# Altium footprint library sun_library.PcbLib: 412 footprints (part 26 of 26)
Each footprint in its own frame and in the unit in brackets; x right, y up, seen from the top. Pads: shape width x height; smd on the part's side, far side on the other; paste and mask are expansions set on the pad; w line width, h text height; cw(c..) or ccw(c..) is an arc to the next point about the centre after c.
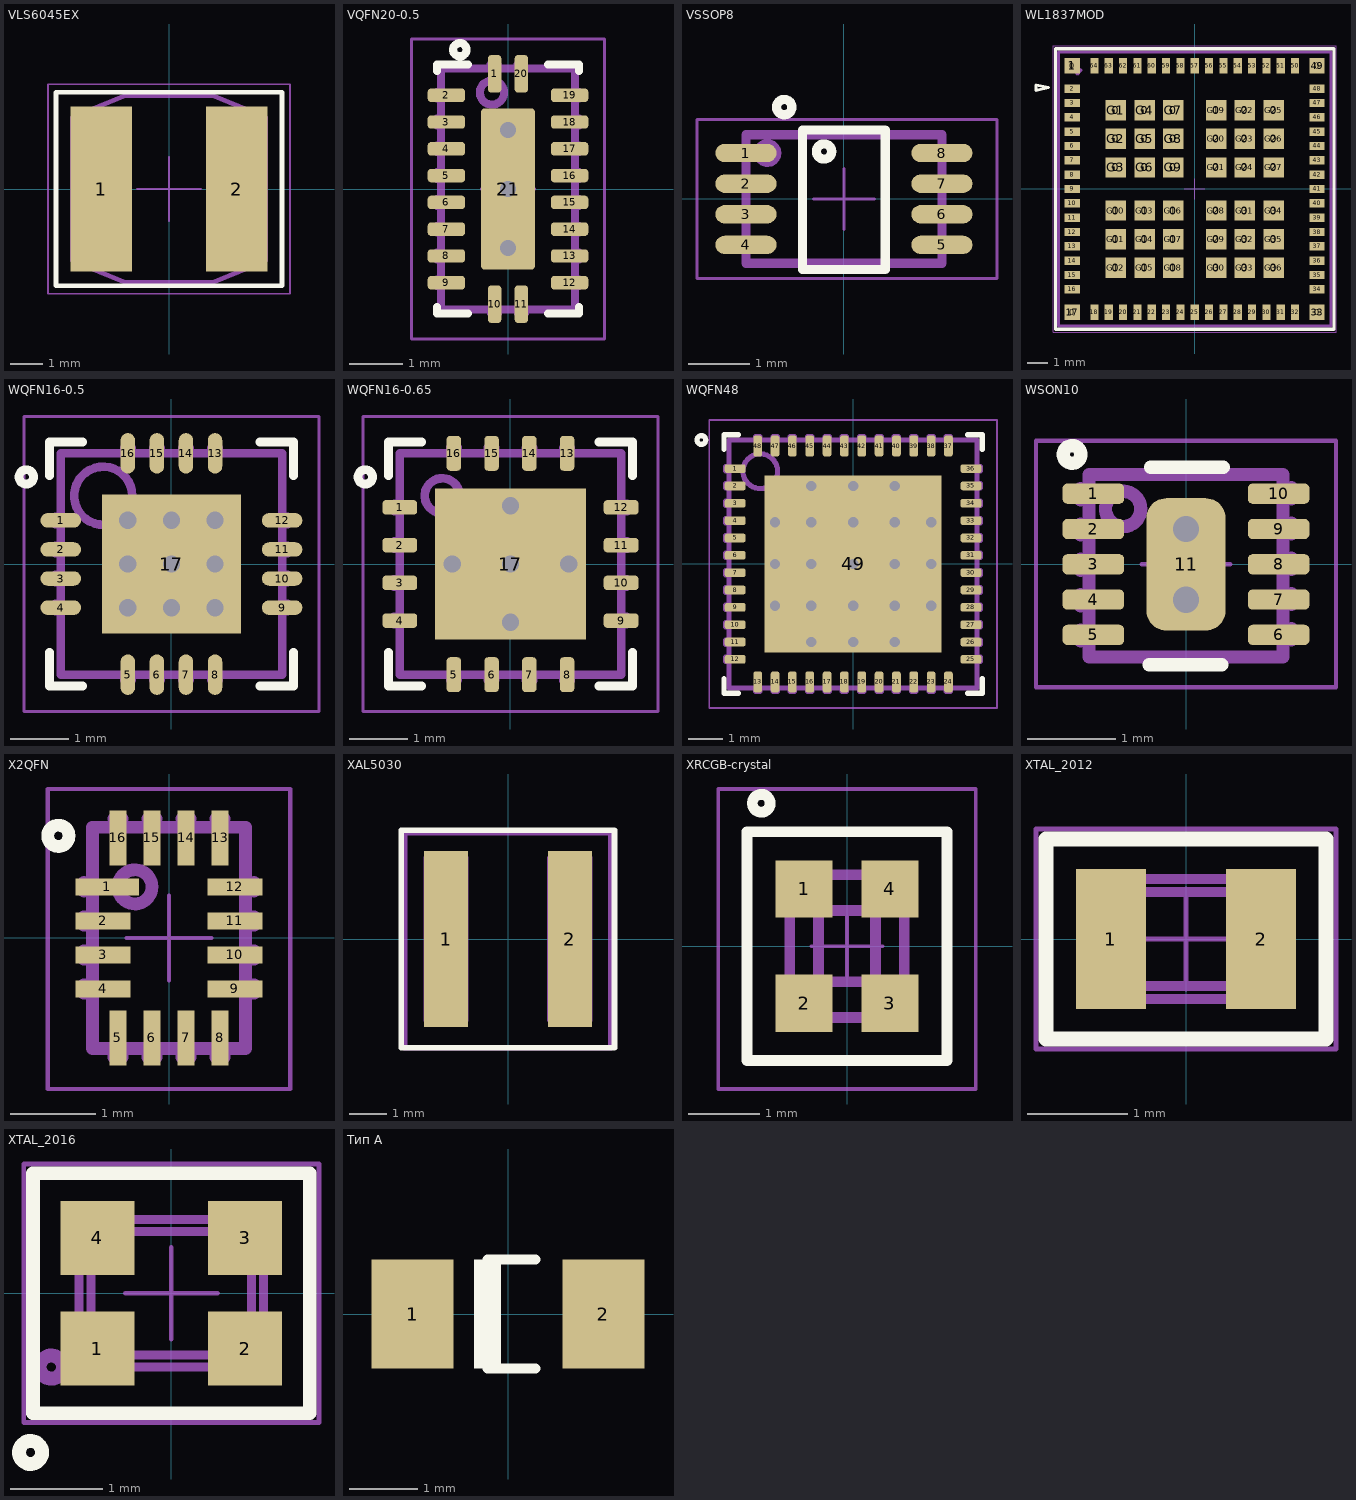
[diagram p25: the footprints below, top view; thin cyan lines are the x and y axes]

## VLS6045EX [mm] "SMT power inductors, VLS6045EX series"
height 3
pads (2):
  rect 1.9x5.1 smd: 1(-2.1,0) 2(2.1,0)
Top Overlay:
  lines w0.15: -3.5,-3 -3.5,3 3.5,3 3.5,-3 -3.5,-3
TopAssy 13:
  circle w0.15: c-1.9,0 r0.4
  lines w0.15: -3,-2.218 -3,2.218 -1.333,2.9 1.333,2.9 3,2.218 3,-2.218 1.333,-2.9 -1.333,-2.9 -3,-2.218
CourtTop 15:
  lines w0.05: -1,0 1,0 ; 0,-1 0,1 ; -3.75,-3.25 3.75,-3.25 3.75,3.25 -3.75,3.25 -3.75,-3.25
3D body "vls6045ex.step": height 4.54, standoff 0.04, extent -2.95,-3 3.05,3

## VQFN20-0.5 [mm] "20-Pin Plastic Quad Flat No-Lead 0.5 mm Pitch, IPC Low Density"
height 1
pads (21):
  rrect50% 0.25x0.7 smd mask+0.075: 1(-0.25,2.15) 10(-0.25,-2.15) 11(0.25,-2.15) 20(0.25,2.15)
  rrect50% 0.7x0.25 smd mask+0.075: 2(-1.15,1.75) 3(-1.15,1.25) 4(-1.15,0.75) 5(-1.15,0.25) 6(-1.15,-0.25) 7(-1.15,-0.75) 8(-1.15,-1.25) 9(-1.15,-1.75) 12(1.15,-1.75) 13(1.15,-1.25) 14(1.15,-0.75) 15(1.15,-0.25) 16(1.15,0.25) 17(1.15,0.75) 18(1.15,1.25) 19(1.15,1.75)
  rrect10% 1x3 smd paste-2 mask+0.075: 21(0,0)
via 0,0 diameter 0.6 hole 0.3
via 0,1.1 diameter 0.6 hole 0.3
via 0,-1.1 diameter 0.6 hole 0.3
Top Overlay:
  circle w0.15: c-0.9,2.6 r0.125
  lines w0.15: -1.325,-2.2 -1.325,-2.325 -0.75,-2.325 ; -1.325,2.2 -1.325,2.325 -0.75,2.325 ; 0.75,-2.325 1.325,-2.325 1.325,-2.2 ; 0.75,2.325 1.325,2.325 1.325,2.2
Top Paste:
  region: 0.4,-0.2 -0.4,-0.2 -0.4,-1.4 0.4,-1.4
  rectangle: -0.4,0.2 0.4,1.4
Bottom Solder:
  rectangle: -0.6,-1.6 0.6,1.6
TopAssy 13:
  circle w0.15: c-0.3,1.8 r0.225
  lines w0.15: -1.325,-1.813 -1.325,-1.688 ; -1.325,-1.313 -1.325,-1.188 ; -1.325,-0.813 -1.325,-0.688 ; -1.325,-0.313 -1.325,-0.188 ; -1.325,0.187 -1.325,0.312 ; -1.325,0.687 -1.325,0.812 ; -1.325,1.187 -1.325,1.312 ; -1.325,1.687 -1.325,1.812 ; -0.325,2.325 -0.2,2.325 ; -0.313,-2.325 -0.188,-2.325 ; 0.175,2.325 0.3,2.325 ; 0.187,-2.325 0.312,-2.325 ; 1.325,-1.812 1.325,-1.687 ; 1.325,-1.312 1.325,-1.187 ; 1.325,-0.812 1.325,-0.687 ; 1.325,-0.312 1.325,-0.187 ; 1.325,0.188 1.325,0.313 ; 1.325,0.688 1.325,0.813 ; 1.325,1.188 1.325,1.313 ; 1.325,1.688 1.325,1.813 ; -1.25,-2.25 1.25,-2.25 1.25,2.25 -1.25,2.25 -1.25,-2.25
CourtTop 15:
  lines w0.05: -0.5,0 0.5,0 ; 0,-0.5 0,-0.25 0,0.25 0,0.5 ; -1.8,-2.8 1.8,-2.8 1.8,2.8 -1.8,2.8 -1.8,-2.8
3D body: height 1.01, standoff 1, extent -0.524,1.576 -0.076,2.024
3D body "User Library-DHVQFN20.STEP": height 1, standoff 0, extent -1.26,-2.26 1.26,2.26

## VSSOP8 [mm] "VSSOP, 8-Leads, Body 2x2.3mm, Pitch 0.5mm, IPC Medium Density"
height 1.2
pads (8):
  oval 1x0.3 smd mask+0.075: 1(-1.6,0.75) 2(-1.6,0.25) 3(-1.6,-0.25) 4(-1.6,-0.75) 5(1.6,-0.75) 6(1.6,-0.25) 7(1.6,0.25) 8(1.6,0.75)
Top Overlay:
  circle w0.15: c-0.325,0.775 r0.125
  circle w0.15: c-0.975,1.5 r0.125
  lines w0.15: -0.675,-1.15 -0.675,1.125 0.675,1.125 0.675,-1.15 -0.675,-1.15
TopAssy 13:
  circle w0.15: c-1.25,0.75 r0.152
  lines w0.15: -1.6,-1.05 -1.6,1.05 1.6,1.05 1.6,-1.05 -1.6,-1.05
CourtTop 15:
  lines w0.05: -0.5,0 0.5,0 ; 0,-0.5 0,0.5 ; -2.4,-1.3 -2.4,1.3 2.5,1.3 2.5,-1.3 -2.4,-1.3
3D body "VSSOP8.step": height 0.9, standoff 0, extent -1.6,-1.05 1.6,1.05

## WL1837MOD [mm] "WL18x7MOD WiLink™ 8 Dual-Band Industrial Module"
pads (200):
  oval 0.75x0.33 on Top Paste: 0(-5.975,4.2) 0(-5.975,-4.9) 0(-5.975,-4.2) 0(-5.975,-3.5) 0(-5.975,-2.8) 0(-5.975,-2.1) 0(-5.975,-1.4) 0(-5.975,-0.7) 0(-5.975,0) 0(-5.975,0.7) 0(-5.975,1.4) 0(-5.975,2.1) 0(-5.975,2.8) 0(-5.975,3.5) 0(-5.975,4.9) 0(5.975,-4.9) 0(5.975,-2.8) 0(5.975,-1.4) 0(5.975,-0.7) 0(5.975,0) 0(5.975,0.7) 0(5.975,2.1) 0(5.975,2.8) 0(5.975,4.2) 0(5.975,4.9) 0(5.975,-4.2) 0(5.975,-3.5) 0(5.975,-2.1) 0(5.975,1.4) 0(5.975,3.5)
  rect 0.525x0.525 on Top Paste: 0(-5.975,6.025) 0(-5.975,-6.025) 0(5.975,-6.025) 0(5.975,6.025)
  oval 0.33x0.75 on Top Paste: 0(-4.9,-6.025) 0(-4.9,6.025) 0(-4.2,-6.025) 0(-4.2,6.025) 0(-3.5,-6.025) 0(-3.5,6.025) 0(-2.8,-6.025) 0(-2.8,6.025) 0(-2.1,-6.025) 0(-2.1,6.025) 0(-1.4,-6.025) 0(-1.4,6.025) 0(-0.7,-6.025) 0(-0.7,6.025) 0(0,-6.025) 0(0,6.025) 0(0.7,-6.025) 0(0.7,6.025) 0(1.4,-6.025) 0(1.4,6.025) 0(2.1,-6.025) 0(2.1,6.025) 0(2.8,6.025) 0(2.8,-6.025) 0(3.5,-6.025) 0(3.5,6.025) 0(4.2,-6.025) 0(4.2,6.025) 0(4.9,-6.025) 0(4.9,6.025)
  rect 0.7x0.7 on Top Paste: 0(-3.85,-3.85) 0(-3.85,-2.45) 0(-3.85,-1.05) 0(-3.85,1.05) 0(-3.85,2.45) 0(-3.85,3.85) 0(-2.45,-3.85) 0(-2.45,-2.45) 0(-2.45,-1.05) 0(-2.45,1.05) 0(-2.45,2.45) 0(-2.45,3.85) 0(-1.05,-3.85) 0(-1.05,-2.45) 0(-1.05,-1.05) 0(-1.05,1.05) 0(-1.05,2.45) 0(-1.05,3.85) 0(1.05,-3.85) 0(1.05,-2.45) 0(1.05,-1.05) 0(1.05,1.05) 0(1.05,2.45) 0(1.05,3.85) 0(2.45,-3.85) 0(2.45,-2.45) 0(2.45,-1.05) 0(2.45,1.05) 0(2.45,2.45) 0(2.45,3.85) 0(3.85,-3.85) 0(3.85,-2.45) 0(3.85,-1.05) 0(3.85,1.05) 0(3.85,2.45) 0(3.85,3.85)
  rect 0.75x0.75 smd paste-2 mask+0.03: 1(-5.975,6.025) 17(-5.975,-6.025) 33(5.975,-6.025) 49(5.975,6.025)
  rect 0.75x0.4 smd paste-2 mask+0.03: 2(-5.975,4.9) 3(-5.975,4.2) 4(-5.975,3.5) 5(-5.975,2.8) 6(-5.975,2.1) 7(-5.975,1.4) 8(-5.975,0.7) 9(-5.975,0) 10(-5.975,-0.7) 11(-5.975,-1.4) 12(-5.975,-2.1) 13(-5.975,-2.8) 14(-5.975,-3.5) 15(-5.975,-4.2) 16(-5.975,-4.9) 34(5.975,-4.9) 35(5.975,-4.2) 36(5.975,-3.5) 37(5.975,-2.8) 38(5.975,-2.1) 39(5.975,-1.4) 40(5.975,-0.7) 41(5.975,0) 42(5.975,0.7) 43(5.975,1.4) 44(5.975,2.1) 45(5.975,2.8) 46(5.975,3.5) 47(5.975,4.2) 48(5.975,4.9)
  rect 0.4x0.75 smd paste-2 mask+0.03: 18(-4.9,-6.025) 19(-4.2,-6.025) 20(-3.5,-6.025) 21(-2.8,-6.025) 22(-2.1,-6.025) 23(-1.4,-6.025) 24(-0.7,-6.025) 25(0,-6.025) 26(0.7,-6.025) 27(1.4,-6.025) 28(2.1,-6.025) 29(2.8,-6.025) 30(3.5,-6.025) 31(4.2,-6.025) 32(4.9,-6.025) 50(4.9,6.025) 51(4.2,6.025) 52(3.5,6.025) 53(2.8,6.025) 54(2.1,6.025) 55(1.4,6.025) 56(0.7,6.025) 57(0,6.025) 58(-0.7,6.025) 59(-1.4,6.025) 60(-2.1,6.025) 61(-2.8,6.025) 62(-3.5,6.025) 63(-4.2,6.025) 64(-4.9,6.025)
  rect 1x1 smd paste-2 mask+0.03: G1(-3.85,3.85) G2(-3.85,2.45) G3(-3.85,1.05) G4(-2.45,3.85) G5(-2.45,2.45) G6(-2.45,1.05) G7(-1.05,3.85) G8(-1.05,2.45) G9(-1.05,1.05) G10(-3.85,-1.05) G11(-3.85,-2.45) G12(-3.85,-3.85) G13(-2.45,-1.05) G14(-2.45,-2.45) G15(-2.45,-3.85) G16(-1.05,-1.05) G17(-1.05,-2.45) G18(-1.05,-3.85) G19(1.05,3.85) G20(1.05,2.45) G21(1.05,1.05) G22(2.45,3.85) G23(2.45,2.45) G24(2.45,1.05) G25(3.85,3.85) G26(3.85,2.45) G27(3.85,1.05) G28(1.05,-1.05) G29(1.05,-2.45) G30(1.05,-3.85) G31(2.45,-1.05) G32(2.45,-2.45) G33(2.45,-3.85) G34(3.85,-1.05) G35(3.85,-2.45) G36(3.85,-3.85)
Top Overlay:
  lines w0.15: -7.75,4.814 -7.15,4.95 -7.75,5.086 -7.75,4.814 ; -6.8,-6.85 6.8,-6.85 6.8,6.85 -6.8,6.85 -6.8,-6.85
TopAssy 13:
  lines w0.15: -6.65,-6.7 6.65,-6.7 6.65,6.7 -6.65,6.7 -6.65,-6.7 ; -6.071,6.128 -5.55,5.8 -5.743,5.607 -6.071,6.128
CourtTop 15:
  lines w0.05: -0.5,0 0.5,0 ; 0,-0.5 0,0.5 ; -6.9,-7 -6.9,7 6.9,7 6.9,-7 -6.9,-7
3D body "model2.stp": height 2, standoff 0, extent -6.65,-6.7 6.65,6.7

## WQFN16-0.5 [mm] "16-Pin Plastic Quad Flat No-Lead 0.5 mm Pitch, IPC Low Density"
height 1
pads (17):
  oval 0.7x0.25 smd mask+0.075: 1(-1.905,0.75) 2(-1.905,0.25) 3(-1.905,-0.25) 4(-1.905,-0.75) 9(1.905,-0.75) 10(1.905,-0.25) 11(1.905,0.25) 12(1.905,0.75)
  oval 0.25x0.7 smd mask+0.075: 5(-0.75,-1.905) 6(-0.25,-1.905) 7(0.25,-1.905) 8(0.75,-1.905) 13(0.75,1.905) 14(0.25,1.905) 15(-0.25,1.905) 16(-0.75,1.905)
  rect 2.4x2.4 smd paste-2 mask+0.075: 17(0,0)
via -0.75,0.75 diameter 0.6 hole 0.3
via 0,0.75 diameter 0.6 hole 0.3
via 0.75,0.75 diameter 0.6 hole 0.3
via 0.75,0 diameter 0.6 hole 0.3
via 0,0 diameter 0.6 hole 0.3
via -0.75,0 diameter 0.6 hole 0.3
via -0.75,-0.75 diameter 0.6 hole 0.3
via 0,-0.75 diameter 0.6 hole 0.3
via 0.75,-0.75 diameter 0.6 hole 0.3
Top Overlay:
  circle w0.15: c-2.5,1.5 r0.125
  lines w0.15: -2.1,-1.525 -2.1,-2.1 -1.525,-2.1 ; -2.1,1.525 -2.1,2.1 -1.525,2.1 ; 1.525,-2.1 2.1,-2.1 2.1,-1.525 ; 1.525,2.1 2.1,2.1 2.1,1.525
Top Paste:
  rectangle: 0.125,-0.75 0.75,-0.125
  rectangle: -0.75,-0.75 -0.125,-0.125
  rectangle: 0.125,0.125 0.75,0.75
  rectangle: -0.75,0.125 -0.125,0.75
Bottom Solder:
  rectangle: -1.3,-1.3 1.3,1.3
TopAssy 13:
  circle w0.15: c-1.175,1.175 r0.5
  lines w0.15: -2,-0.813 -2,-0.688 ; -2,-0.313 -2,-0.188 ; -2,0.187 -2,0.312 ; -2,0.687 -2,0.812 ; -0.812,-2 -0.687,-2 ; -0.813,2 -0.688,2 ; -0.312,-2 -0.187,-2 ; -0.313,2 -0.188,2 ; 0.188,-2 0.313,-2 ; 0.187,2 0.312,2 ; 0.688,-2 0.813,-2 ; 0.687,2 0.812,2 ; 2,-0.812 2,-0.687 ; 2,-0.312 2,-0.187 ; 2,0.188 2,0.313 ; 2,0.688 2,0.813 ; -1.905,-1.905 1.905,-1.905 1.905,1.905 -1.905,1.905 -1.905,-1.905
CourtTop 15:
  lines w0.05: -0.5,0 0.5,0 ; 0,-0.5 0,-0.25 0,0.25 0,0.5 ; -2.54,-2.54 2.54,-2.54 2.54,2.54 -2.54,2.54 -2.54,-2.54
3D body "User Library-WQFN-16 4x4mm 0_5mmPitch.step": height 0.8, standoff -0.01, extent -2.01,-2.02 2.01,2

## WQFN16-0.65 [mm] "16-Pin Plastic Quad Flat No-Lead 0.65 mm Pitch, IPC Low Density"
height 1
pads (17):
  rrect50% 0.6x0.25 smd mask+0.075: 1(-1.905,0.975) 2(-1.905,0.325) 3(-1.905,-0.325) 4(-1.905,-0.975) 9(1.905,-0.975) 10(1.905,-0.325) 11(1.905,0.325) 12(1.905,0.975)
  rrect50% 0.25x0.6 smd mask+0.075: 5(-0.975,-1.905) 6(-0.325,-1.905) 7(0.325,-1.905) 8(0.975,-1.905) 13(0.975,1.905) 14(0.325,1.905) 15(-0.325,1.905) 16(-0.975,1.905)
  rect 2.6x2.6 smd paste-2 mask+0.075: 17(0,0)
via 0,-1 diameter 0.6 hole 0.3
via 0,1 diameter 0.6 hole 0.3
via 1,0 diameter 0.6 hole 0.3
via -1,0 diameter 0.6 hole 0.3
via 0,0 diameter 0.6 hole 0.3
Top Overlay:
  circle w0.15: c-2.5,1.5 r0.125
  lines w0.15: -2.1,-1.525 -2.1,-2.1 -1.525,-2.1 ; -2.1,1.525 -2.1,2.1 -1.525,2.1 ; 1.525,-2.1 2.1,-2.1 2.1,-1.525 ; 1.525,2.1 2.1,2.1 2.1,1.525
Top Paste:
  rectangle: 0.275,-1.175 1.175,-0.275
  rectangle: -1.175,-1.175 -0.275,-0.275
  rectangle: 0.275,0.275 1.175,1.175
  rectangle: -1.175,0.275 -0.275,1.175
Bottom Solder:
  rectangle: -1.4,-1.4 1.4,1.4
TopAssy 13:
  circle w0.15: c-1.175,1.175 r0.301
  lines w0.15: -2.005,-1.037 -2.005,-0.913 ; -2.005,-0.387 -2.005,-0.263 ; -2,0.263 -2,0.387 ; -2,0.913 -2,1.037 ; -1.037,-2 -0.913,-2 ; -1.037,2.005 -0.913,2.005 ; -0.387,-2 -0.263,-2 ; -0.387,2.005 -0.263,2.005 ; 0.263,-2.005 0.387,-2.005 ; 0.263,2 0.387,2 ; 0.913,-2.005 1.037,-2.005 ; 0.913,2 1.037,2 ; 2,-1.037 2,-0.913 ; 2,-0.387 2,-0.263 ; 2.005,0.263 2.005,0.387 ; 2.005,0.913 2.005,1.037 ; -1.905,-1.905 1.905,-1.905 1.905,1.905 -1.905,1.905 -1.905,-1.905
CourtTop 15:
  lines w0.05: -0.5,0 0.5,0 ; 0,-0.5 0,-0.25 0,0.25 0,0.5 ; -2.54,-2.54 2.54,-2.54 2.54,2.54 -2.54,2.54 -2.54,-2.54
3D body "User Library-qfn16-4x4.step": height 0.92, standoff 0, extent -2,-2.01 2,1.99

## WQFN48 [mm] "WQFN, 48-Leads, Body 7x7mm, Pitch 0.5mm, IPC Medium Density"
height 0.8
pads (49):
  rrect50% 0.6x0.25 smd mask+0.05: 1(-3.4,2.75) 2(-3.4,2.25) 3(-3.4,1.75) 4(-3.4,1.25) 5(-3.4,0.75) 6(-3.4,0.25) 7(-3.4,-0.25) 8(-3.4,-0.75) 9(-3.4,-1.25) 10(-3.4,-1.75) 11(-3.4,-2.25) 12(-3.4,-2.75) 25(3.4,-2.75) 26(3.4,-2.25) 27(3.4,-1.75) 28(3.4,-1.25) 29(3.4,-0.75) 30(3.4,-0.25) 31(3.4,0.25) 32(3.4,0.75) 33(3.4,1.25) 34(3.4,1.75) 35(3.4,2.25) 36(3.4,2.75)
  rrect50% 0.25x0.6 smd mask+0.05: 13(-2.75,-3.4) 14(-2.25,-3.4) 15(-1.75,-3.4) 16(-1.25,-3.4) 17(-0.75,-3.4) 18(-0.25,-3.4) 19(0.25,-3.4) 20(0.75,-3.4) 21(1.25,-3.4) 22(1.75,-3.4) 23(2.25,-3.4) 24(2.75,-3.4) 37(2.75,3.4) 38(2.25,3.4) 39(1.75,3.4) 40(1.25,3.4) 41(0.75,3.4) 42(0.25,3.4) 43(-0.25,3.4) 44(-0.75,3.4) 45(-1.25,3.4) 46(-1.75,3.4) 47(-2.25,3.4) 48(-2.75,3.4)
  rect 5.1x5.1 smd paste-3 mask+0.075: 49(0,0)
via -1.2,1.2 diameter 0.6 hole 0.3
via 0,1.2 diameter 0.6 hole 0.3
via 0,2.25 diameter 0.6 hole 0.3
via 0,0 diameter 0.6 hole 0.3
via 1.2,1.2 diameter 0.6 hole 0.3
via -1.2,-1.2 diameter 0.6 hole 0.3
via 1.2,-1.2 diameter 0.6 hole 0.3
via -1.2,0 diameter 0.6 hole 0.3
via 0,-1.2 diameter 0.6 hole 0.3
via 1.2,0 diameter 0.6 hole 0.3
via -2.25,0 diameter 0.6 hole 0.3
via 0,-2.25 diameter 0.6 hole 0.3
via 2.25,0 diameter 0.6 hole 0.3
via 1.2,2.25 diameter 0.6 hole 0.3
via -2.25,1.2 diameter 0.6 hole 0.3
via -1.2,-2.25 diameter 0.6 hole 0.3
via 2.25,-1.2 diameter 0.6 hole 0.3
via -1.2,2.25 diameter 0.6 hole 0.3
via -2.25,-1.2 diameter 0.6 hole 0.3
via 1.2,-2.25 diameter 0.6 hole 0.3
via 2.25,1.2 diameter 0.6 hole 0.3
Top Overlay:
  circle w0.15: c-4.375,3.575 r0.125
  lines w0.15: -3.725,-3.3 -3.725,-3.725 -3.3,-3.725 ; -3.725,3.3 -3.725,3.725 -3.3,3.725 ; 3.3,-3.725 3.725,-3.725 3.725,-3.3 ; 3.3,3.725 3.725,3.725 3.725,3.3
Top Paste:
  rectangle: 1.35,1.35 2.25,2.25
  rectangle: 0.15,1.35 1.05,2.25
  rectangle: -1.05,1.35 -0.15,2.25
  rectangle: -2.25,1.35 -1.35,2.25
  rectangle: -2.25,0.15 -1.35,1.05
  rectangle: -1.05,0.15 -0.15,1.05
  rectangle: 0.15,0.15 1.05,1.05
  rectangle: 1.35,0.15 2.25,1.05
  rectangle: 1.35,-1.05 2.25,-0.15
  rectangle: 0.15,-1.05 1.05,-0.15
  rectangle: -1.05,-1.05 -0.15,-0.15
  rectangle: -2.25,-1.05 -1.35,-0.15
  rectangle: -2.25,-2.25 -1.35,-1.35
  rectangle: -1.05,-2.25 -0.15,-1.35
  rectangle: 0.15,-2.25 1.05,-1.35
  rectangle: 1.35,-2.25 2.25,-1.35
Bottom Solder:
  rectangle: -2.6,-2.6 2.6,2.6
TopAssy 13:
  circle w0.15: c-2.675,2.675 r0.5
  lines w0.15: -3.675,-2.812 -3.675,-2.687 ; -3.675,-2.312 -3.675,-2.187 ; -3.675,-1.812 -3.675,-1.687 ; -3.675,-1.312 -3.675,-1.187 ; -3.675,-0.813 -3.675,-0.687 ; -3.675,-0.313 -3.675,-0.187 ; -3.675,0.188 -3.675,0.313 ; -3.675,0.688 -3.675,0.813 ; -3.675,1.188 -3.675,1.313 ; -3.675,1.687 -3.675,1.813 ; -3.675,2.188 -3.675,2.313 ; -3.675,2.688 -3.675,2.813 ; -2.813,-3.675 -2.688,-3.675 ; -2.812,3.675 -2.687,3.675 ; -2.313,-3.675 -2.188,-3.675 ; -2.312,3.675 -2.187,3.675 ; -1.813,-3.675 -1.687,-3.675 ; -1.812,3.675 -1.687,3.675 ; -1.313,-3.675 -1.188,-3.675 ; -1.312,3.675 -1.187,3.675 ; -0.813,-3.675 -0.688,-3.675 ; -0.813,3.675 -0.687,3.675 ; -0.313,-3.675 -0.188,-3.675 ; -0.313,3.675 -0.187,3.675 ; 0.187,-3.675 0.313,-3.675 ; 0.188,3.675 0.313,3.675 ; 0.687,-3.675 0.813,-3.675 ; 0.688,3.675 0.813,3.675 ; 1.187,-3.675 1.312,-3.675 ; 1.188,3.675 1.313,3.675 ; 1.687,-3.675 1.812,-3.675 ; 1.687,3.675 1.813,3.675 ; 2.187,-3.675 2.312,-3.675 ; 2.188,3.675 2.313,3.675 ; 2.687,-3.675 2.812,-3.675 ; 2.688,3.675 2.813,3.675 ; 3.675,-2.813 3.675,-2.688 ; 3.675,-2.313 3.675,-2.188 ; 3.675,-1.813 3.675,-1.687 ; 3.675,-1.313 3.675,-1.188 ; 3.675,-0.813 3.675,-0.688 ; 3.675,-0.313 3.675,-0.188 ; 3.675,0.187 3.675,0.312 ; 3.675,0.687 3.675,0.813 ; 3.675,1.187 3.675,1.312 ; 3.675,1.687 3.675,1.812 ; 3.675,2.187 3.675,2.312 ; 3.675,2.687 3.675,2.812 ; -3.575,-3.575 -3.575,3.575 3.575,3.575 3.575,-3.575 -3.575,-3.575
CourtTop 15:
  lines w0.05: -0.5,0 0.5,0 ; 0,-0.5 0,0.5 ; -4.15,-4.15 -4.15,4.15 4.15,4.15 4.15,-4.15 -4.15,-4.15
3D body "User Library-QFN48_7x7.STEP": height 0.8, standoff 0, extent -3.51,-3.51 3.51,3.51

## WSON10 [mm] "WSON, 8-Leads, Body 2,00x2,00mm, Pitch 0,40mm, Thermal Pad 0,9x1,5mm, IPC Medium Density"
height 0.8
pads (11):
  rrect50% 0.7x0.23 smd paste-1 mask+0.025: 1(-1.05,0.8) 2(-1.05,0.4) 3(-1.05,0) 4(-1.05,-0.4) 5(-1.05,-0.8) 6(1.05,-0.8) 7(1.05,-0.4) 8(1.05,0) 9(1.05,0.4) 10(1.05,0.8)
  rrect50% 0.9x1.5 smd paste-1 mask+0.05: 11(0,0)
via 0,0.4 diameter 0.6 hole 0.3
via 0,-0.4 diameter 0.6 hole 0.3
Top Overlay:
  circle w0.15: c-1.291,1.245 r0.1
  lines w0.15: -0.419,-1.137 0.406,-1.137 ; -0.404,1.1 0.421,1.1
Top Paste:
  drawing of 11 lines, arcs and shapes, not listed
TopAssy 13:
  circle w0.15: c-0.713,0.628 r0.2
  lines w0.15: -1.195,-0.869 -1.195,-0.744 ; -1.195,-0.469 -1.195,-0.344 ; -1.195,-0.069 -1.195,0.056 ; -1.195,0.331 -1.195,0.456 ; -1.195,0.731 -1.195,0.856 ; -1.1,-1.012 -1.1,-0.887 ; 1.1,-1.012 1.1,-0.887 ; 1.195,-0.856 1.195,-0.731 ; 1.195,-0.456 1.195,-0.331 ; 1.195,-0.056 1.195,0.069 ; 1.195,0.344 1.195,0.469 ; 1.195,0.744 1.195,0.869 ; -1.1,-1.05 1.1,-1.05 1.1,1.018 -1.1,1.018 -1.1,-1.05
CourtTop 15:
  lines w0.005: -1.36,0.885 cw(c-1.325,0.85) -1.325,0.9 -0.775,0.9 cw(c-0.775,0.85) -0.74,0.885 ; -1.36,0.885 ccw(c-1.325,0.85) -1.375,0.85 -1.375,0.75 ccw(c-1.325,0.75) -1.36,0.715 ccw(c-1.325,0.75) -1.325,0.7 -0.775,0.7 ccw(c-0.775,0.75) -0.74,0.715 ; -1.36,0.885 -1.36,0.885 ; -0.74,0.715 ccw(c-0.775,0.75) -0.725,0.75 -0.725,0.85 ccw(c-0.775,0.85) -0.74,0.885 ; -0.74,0.715 -0.74,0.715 ; -0.74,0.885 -0.74,0.885
  lines w0.05: -0.5,0 0.5,0 ; 0,-0.5 0,0.5 ; -1.7,-1.393 1.7,-1.393 1.7,1.4 -1.7,1.4 -1.7,-1.393
3D body "User Library-SON40P200X200-10TP.step": height 0.82, standoff 0.01, extent -1.082,-1.05 1.082,1.05

## X2QFN [mm] "X2QFN, 10-Leads, Body 2,00x1,50mm, Pitch 0,50mm"
height 0.4
pads (16):
  rect 0.75x0.2 smd paste-0.5 mask+0.05: 1(-0.725,0.6)
  rect 0.65x0.2 smd paste-0.5 mask+0.05: 2(-0.775,0.2) 3(-0.775,-0.2) 4(-0.775,-0.6) 9(0.775,-0.6) 10(0.775,-0.2) 11(0.775,0.2) 12(0.775,0.6)
  rect 0.2x0.65 smd paste-0.5 mask+0.05: 5(-0.6,-1.175) 6(-0.2,-1.175) 7(0.2,-1.175) 8(0.6,-1.175) 13(0.6,1.175) 14(0.2,1.175) 15(-0.2,1.175) 16(-0.6,1.175)
Top Overlay:
  circle w0.15: c-1.3,1.2 r0.125
Top Paste:
  drawing of 16 lines, arcs and shapes, not listed
TopAssy 13:
  circle w0.15: c-0.4,0.6 r0.2
  lines w0.15: -1,-0.65 -1,-0.55 ; -1,-0.25 -1,-0.15 ; -1,0.15 -1,0.25 ; -1,0.55 -1,0.65 ; -0.65,-1.4 -0.55,-1.4 ; -0.65,1.4 -0.55,1.4 ; -0.25,-1.4 -0.15,-1.4 ; -0.25,1.4 -0.15,1.4 ; 0.15,-1.4 0.25,-1.4 ; 0.15,1.4 0.25,1.4 ; 0.55,-1.4 0.65,-1.4 ; 0.55,1.4 0.65,1.4 ; 1,-0.65 1,-0.55 ; 1,-0.25 1,-0.15 ; 1,0.15 1,0.25 ; 1,0.55 1,0.65 ; -0.9,-1.3 -0.9,1.3 0.9,1.3 0.9,-1.3 -0.9,-1.3
CourtTop 15:
  lines w0.05: -0.5,0 0.5,0 ; 0,-0.5 0,0.5 ; -1.425,-1.775 -1.425,1.75 1.425,1.75 1.425,-1.775 -1.425,-1.775
3D body "User Library-UQFN-16.step": height 0.6, standoff 0, extent -0.924,-1.328 0.926,1.322

## XAL5030 [mm] "Shielded Power Inductors Colicraft"
pads (2):
  rect 1.18x4.7 smd: 1(-1.655,0) 2(1.655,0)
Top Overlay:
  lines w0.15: -2.855,-2.9 -2.855,2.9 2.845,2.9 2.845,-2.9 -2.855,-2.9
TopAssy 13:
  region: -2.255,2.2 -1.055,2.2 -1.055,-2.2 -2.255,-2.2
  region: 1.045,2.2 2.245,2.2 2.245,-2.2 1.045,-2.2
  lines w0.15: -2.755,-2.9 2.745,-2.9 2.745,2.84 -2.755,2.84 -2.755,-2.9
3D body "Coilcraft-XAL5030-332.step": height 3, standoff -0.1, extent -2.745,-2.84 2.735,2.84

## XRCGB-crystal [mm] "Crystal Resonator XRCGB series murata"
height 0.65
pads (4):
  rect 0.8x0.8 smd: 1(-0.6,0.8) 2(-0.6,-0.8) 3(0.6,-0.8) 4(0.6,0.8)
Top Overlay:
  circle w0.15: c-1.2,2 r0.125
  lines w0.15: -1.4,-1.6 1.4,-1.6 1.4,1.6 -1.4,1.6 -1.4,-1.6
TopAssy 13:
  lines w0.15: -0.8,-1 -0.8,1 0.8,1 0.8,-1 -0.8,-1 ; -0.4,-0.5 0.4,-0.5 0.4,0.5 -0.4,0.5 -0.4,-0.5
CourtTop 15:
  lines w0.05: -0.5,0 0.5,0 ; 0,-0.5 0,0.5 ; -1.8,-2 1.8,-2 1.8,2.2 -1.8,2.2 -1.8,-2
3D body "User Library-XRCGB27M000F2P00R0.step": height 0.65, standoff 0, extent -0.8,-1 0.8,1

## XTAL_2012 [mm] "Crystal 2.0 x 1.2 mm"
height 0.9
pads (2):
  rect 0.7x1.4 smd: 1(-0.75,0) 2(0.75,0)
Top Overlay:
  lines w0.15: -1.4,-1 1.4,-1 1.4,1 -1.4,1 -1.4,-1
TopAssy 13:
  lines w0.1: -1,-0.5 -1,0.5 ccw(c-1,0.6) -0.9,0.6 0.9,0.6 ccw(c1,0.6) 1,0.5 1,-0.5 ccw(c1,-0.6) 0.9,-0.6 -0.9,-0.6 ccw(c-1,-0.6) -1,-0.5 ; -0.87,0.379 -0.87,-0.37 ccw(c-0.77,-0.37) -0.77,-0.47 0.77,-0.47 ccw(c0.77,-0.37) 0.87,-0.37 0.87,0.37 ccw(c0.77,0.37) 0.77,0.47 -0.77,0.47 ccw(c-0.77,0.379) -0.861,0.379
CourtTop 15:
  lines w0.05: -0.5,0 0.5,0 ; 0,-0.5 0,0.5 ; -1.5,-1.1 1.5,-1.1 1.5,1.1 -1.5,1.1 -1.5,-1.1
3D body "User Library-ABS06.STEP": height 0.6, standoff 0, extent -1,-0.61 1,0.61

## XTAL_2016 [mm] "Crystal Resonator XRCGB series murata 2.00x1.6mm"
height 0.65
pads (4):
  rect 0.8x0.8 smd: 1(-0.8,-0.6) 2(0.8,-0.6) 3(0.8,0.6) 4(-0.8,0.6)
Top Overlay:
  circle w0.15: c-1.525,-1.725 r0.125
  lines w0.15: -1.5,-1.3 1.5,-1.3 1.5,1.3 -1.5,1.3 -1.5,-1.3
TopAssy 13:
  circle w0.15: c-1.3,-0.8 r0.125
  lines w0.1: -1,-0.7 cw(c-1,-0.8) -0.9,-0.8 0.9,-0.8 cw(c1,-0.8) 1,-0.7 1,0.7 cw(c1,0.8) 0.9,0.8 -0.9,0.8 cw(c-1,0.8) -1,0.7 -1,-0.7 ; -0.87,-0.57 ccw(c-0.77,-0.57) -0.77,-0.67 0.77,-0.67 ccw(c0.77,-0.57) 0.87,-0.57 0.87,0.57 ccw(c0.77,0.57) 0.77,0.67 -0.77,0.67 ccw(c-0.77,0.57) -0.87,0.57 -0.87,-0.57
CourtTop 15:
  lines w0.05: -0.5,0 0.5,0 ; 0,-0.5 0,0.5 ; -1.6,-1.4 1.6,-1.4 1.6,1.4 -1.6,1.4 -1.6,-1.4
3D body "User Library-XRCGB27M000F2P00R0.step": height 0.65, standoff 0, extent -1,-0.8 1,0.8

## Тип А [mm] "Танталовый чип конденсатор"
height 1.6
pads (2):
  rect 1.2x1.6 smd: 1(-1.4,0) 2(1.4,0)
Top Overlay:
  rectangle: -0.5,-0.8 -0.1,0.8
  lines w0.15: -0.3,-0.8 0.4,-0.8 ; -0.3,0.8 0.4,0.8
3D body "A Case SMT Capacitor.STEP": height 1.58, standoff -0.02, extent -1.572,-0.8 1.602,0.8